# Altium footprint library AltiumilePcbCizimi_Library.PcbLib: 26 footprints (part 2 of 2)
Each footprint in its own frame and in the unit in brackets; x right, y up, seen from the top. Pads: shape width x height; smd on the part's side, far side on the other; paste and mask are expansions set on the pad; w line width, h text height; cw(c..) or ccw(c..) is an arc to the next point about the centre after c.
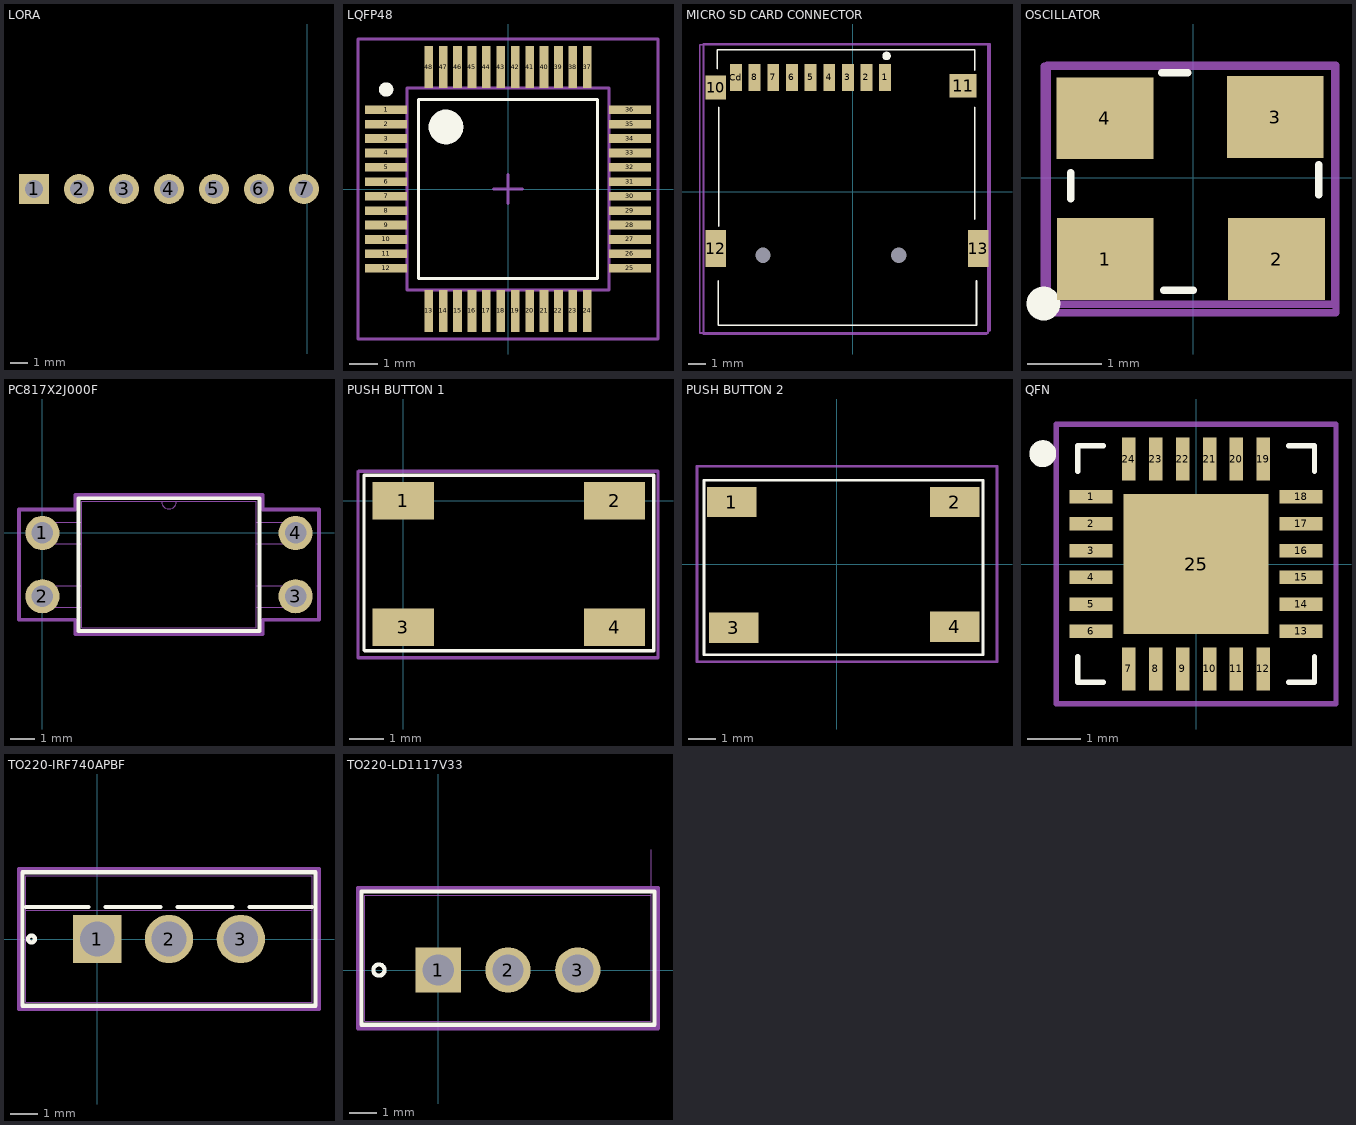
[diagram p1: the footprints below, top view; thin cyan lines are the x and y axes]

## LORA [mm] "E32-TTL-100 SX1278 433 MHz"
pads (7):
  rect 1.7x1.7 hole 1: 1(-15.436,55.692)
  round 1.7 hole 1: 2(-12.896,55.692) 3(-10.356,55.692) 4(-7.816,55.692) 5(-5.276,55.692) 6(-2.736,55.692) 7(-0.196,55.692)
3D body: height 26.07, standoff 16.07, extent 18.4,-0.2 18.4,-0.2
3D body "E32-TTL-100 module.STEP": height 68.25, standoff -6.03, extent -19.236,-19.83 120.721,57.192

## LQFP48 [mm] "TSQFP, 48-Leads, Body 7,00x7,00mm, Pitch 0,50mm, IPC Medium Density"
height 1.6
pads (48):
  rect 1.45x0.3 smd mask+0.05: 1(-4.225,2.75) 2(-4.225,2.25) 3(-4.225,1.75) 4(-4.225,1.25) 5(-4.225,0.75) 6(-4.225,0.25) 7(-4.225,-0.25) 8(-4.225,-0.75) 9(-4.225,-1.25) 10(-4.225,-1.75) 11(-4.225,-2.25) 12(-4.225,-2.75) 25(4.225,-2.75) 26(4.225,-2.25) 27(4.225,-1.75) 28(4.225,-1.25) 29(4.225,-0.75) 30(4.225,-0.25) 31(4.225,0.25) 32(4.225,0.75) 33(4.225,1.25) 34(4.225,1.75) 35(4.225,2.25) 36(4.225,2.75)
  rect 0.3x1.45 smd mask+0.05: 13(-2.75,-4.225) 14(-2.25,-4.225) 15(-1.75,-4.225) 16(-1.25,-4.225) 17(-0.75,-4.225) 18(-0.25,-4.225) 19(0.25,-4.225) 20(0.75,-4.225) 21(1.25,-4.225) 22(1.75,-4.225) 23(2.25,-4.225) 24(2.75,-4.225) 37(2.75,4.225) 38(2.25,4.225) 39(1.75,4.225) 40(1.25,4.225) 41(0.75,4.225) 42(0.25,4.225) 43(-0.25,4.225) 44(-0.75,4.225) 45(-1.25,4.225) 46(-1.75,4.225) 47(-2.25,4.225) 48(-2.75,4.225)
Top Overlay:
  circle w0.25: c-4.225,3.45 r0.125
  circle w0.6: c-2.15,2.15 r0.3
  lines w0.1: -3.1,-3.1 -3.1,3.1 3.1,3.1 3.1,-3.1 -3.1,-3.1
Mechanical 13:
  circle w0.1: c-2.127,2.172 r0.5
  lines w0.1: -3.5,-3.5 -3.5,3.5 3.5,3.5 3.5,-3.5 -3.5,-3.5
Mechanical 15:
  lines w0.1: -0.5,0 0.5,0 ; 0,-0.5 0,0.5 ; -5.2,-5.2 -5.2,5.2 5.2,5.2 5.2,-5.2 -5.2,-5.2
3D body "LQFP48.step": height 1.6, standoff 0, extent -4.5,-4.5 4.5,4.5

## MICRO SD CARD CONNECTOR [mm]
pads (15):
  rect 0.7x1.6 smd paste+0 mask+0: 1(1.918,6.735) 2(0.818,6.735) 3(-0.282,6.735) 4(-1.382,6.735) 5(-2.482,6.735) 6(-3.582,6.735) 7(-4.682,6.735) 8(-5.782,6.735) Cd(-6.882,6.735)
  rect 1.2x1.4 smd paste+0 mask+0: 10(-8.082,6.135)
  rect 1.6x1.4 smd paste+0 mask+0: 11(6.518,6.235)
  rect 1.2x2.2 smd paste+0 mask+0: 12(-8.082,-3.365) 13(7.418,-3.365)
  round 0 hole 0.9 unplated paste-1000 mask+0: ""(-5.282,-3.765) ""(2.718,-3.765)
Top Overlay:
  circle w0.25: c2,8 r0.125
  lines w0.1: -7.991,7.259 -7.991,8.359 7.209,8.359 7.209,7.159 ; -7.923,-5.265 -7.923,-7.888 7.309,-7.888 7.309,-5.265 ; -7.891,-2.041 -7.891,4.959 ; 7.209,-1.641 7.209,4.959
Mechanical 3:
  lines w0.1: -9.016,-8.341 -9.016,8.659 -8.516,8.659 7.734,8.659 7.984,8.659 7.984,-8.341 -9.016,-8.341
Mechanical 15:
  lines w0.1: -8.8,-8.4 -8.8,8.7 8.1,8.7 8.1,-8.2 7.9,-8.4 -8.8,-8.4
3D body "User Library-MEM2055-00-190-01-A_revG.step": height 1.85, standoff -0.6, extent -8.333,-7.76 7.667,7.49

## OSCILLATOR [mm] "8MHZ 12.5pF"
pads (4):
  rect 1.3x1.1 smd mask+0.05: 1(-1.181,-1.09) 2(1.119,-1.09) 3(1.103,0.817) 4(-1.186,0.801)
Top Overlay:
  circle w0.254: c-2.012,-1.689 r0.1
  lines w0.1: -1.645,-0.282 -1.645,0.072 ; -0.424,1.41 -0.07,1.41 ; -0.399,-1.511 0.001,-1.511 ; 1.684,-0.224 1.684,0.176
Mechanical 3:
  circle w0.254: c-1.416,-1.124 r0.1
  lines w0.1: -1.961,-1.811 -1.961,1.513 1.918,1.513 1.918,-1.811 -1.961,-1.811
Mechanical 15:
  lines w0.1: -2,-1.8 -1.9,-1.7 1.9,-1.7 1.9,1.5 -2,1.5 -2,-1.8
3D body "ASE3.STEP": height 1.22, standoff -0.03, extent -1.579,-1.241 1.621,1.259

## PC817X2J000F [mil]
pads (4):
  round 54 hole 34 mask+0: 1(0,0) 2(0,-100) 3(400,-100) 4(400,0)
Top Overlay:
  lines w6: 57,-155 57,55 343,55 343,-155 57,-155
Mechanical 13:
  lines w0: 188,50 ccw(c200,50) 212,50
  lines w1: -17,-117 62,-117 62,-83 -17,-83 -17,-117 ; -17,-17 62,-17 62,17 -17,17 -17,-17 ; 62,-150 62,50 338,50 338,-150 62,-150 ; 338,-117 417,-117 417,-83 338,-83 338,-117 ; 338,-17 417,-17 417,17 338,17 338,-17
Mechanical 15:
  lines w6: -37,-137 52,-137 52,-160 348,-160 348,-137 437,-137 437,37 348,37 348,60 52,60 52,37 -37,37 -37,-137
3D body: height 10, standoff 0, extent 0,0 10,10

## PUSH BUTTON 1 [mm]
pads (4):
  rect 1.8x1.1 smd mask+0.05: 1(0,0) 2(6.2,0) 3(0,-3.7) 4(6.2,-3.7)
Top Overlay:
  lines w0.1: -1.15,-4.375 -1.15,0.75 7.35,0.75 7.35,-4.4 -1.125,-4.4
Mechanical 3:
  lines w0.1: -1.325,-4.6 -1.325,0.85 -1.3,0.875 7.475,0.875 7.475,-4.6 -1.325,-4.6
3D body "User Library-4x4_SMD_Switch.step": height 1.5, standoff 0, extent -0.2,-4.5 6.2,0.7

## PUSH BUTTON 2 [mm]
pads (4):
  rect 1.8x1.1 smd mask+0.05: 1(-3.81,2.254) 2(4.3,2.254) 3(-3.748,-2.322) 4(4.3,-2.286)
Top Overlay:
  lines w0.1: -4.826,-3.302 -4.826,3.048 5.334,3.048 5.334,-3.302 -4.826,-3.302
Mechanical 15:
  lines w0.1: -5.08,-3.556 -5.08,3.302 -5.08,3.556 5.842,3.556 5.842,-3.556 -5.08,-3.556
3D body "User Library-KFC-A06-HA-4_3.STEP": height 4.3, standoff 0, extent -4.246,-3.048 4.754,2.952

## QFN [mm] "QFN, 24-Leads, Body 4,00x4,00mm, Pitch 0,50mm, Thermal Pad 2,70x2,60mm, IPC Medium Density"
height 0.95
pads (25):
  rect 0.8x0.25 smd mask+0.05: 1(-1.95,1.25) 2(-1.95,0.75) 3(-1.95,0.25) 4(-1.95,-0.25) 5(-1.95,-0.75) 6(-1.95,-1.25) 13(1.95,-1.25) 14(1.95,-0.75) 15(1.95,-0.25) 16(1.95,0.25) 17(1.95,0.75) 18(1.95,1.25)
  rect 0.25x0.8 smd mask+0.05: 7(-1.25,-1.95) 8(-0.75,-1.95) 9(-0.25,-1.95) 10(0.25,-1.95) 11(0.75,-1.95) 12(1.25,-1.95) 19(1.25,1.95) 20(0.75,1.95) 21(0.25,1.95) 22(-0.25,1.95) 23(-0.75,1.95) 24(-1.25,1.95)
  rect 2.7x2.6 smd mask+0.05: 25(0,0)
Top Overlay:
  circle w0.25: c-2.85,2.05 r0.125
  lines w0.1: -2.2,-1.725 -2.2,-2.2 -1.725,-2.2 ; -2.2,1.725 -2.2,2.2 -1.725,2.2 ; 1.725,-2.2 2.2,-2.2 2.2,-1.725 ; 1.725,2.2 2.2,2.2 2.2,1.725
Mechanical 15:
  lines w0.1: -0.5,0 0.5,0 ; 0,-0.5 0,0.5 ; -2.6,-2.6 -2.6,2.6 2.6,2.6 2.6,-2.6 -2.6,-2.6
3D body "QFN.step": height 0.95, standoff 0, extent -2.07,-2.07 2.07,2.07

## TO220-IRF740APBF [mil]
pads (3):
  rect 70x70 / inner round 70 / far side round 70 hole 50 mask+0: 1(0,0)
  round 70 hole 50 mask+0: 2(103.94,0) 3(207.87,0)
Top Overlay:
  circle w6: c-95,0 r5
  lines w6: -103.06,46.5 -12.3,46.5 ; 12.3,46.5 91.63,46.5 ; 116.24,46.5 195.57,46.5 ; 220.18,46.5 310.94,46.5 ; -108.06,-96.5 -108.06,96.5 315.94,96.5 315.94,-96.5 -108.06,-96.5
Mechanical 7:
Mechanical 13:
  circle w0: c-93.06,0 r5
  lines w1: -103.06,41.5 310.94,41.5 ; -103.06,-91.5 -103.06,91.5 310.94,91.5 310.94,-91.5 -103.06,-91.5
Mechanical 15:
  lines w6: -113.06,-101.5 320.94,-101.5 320.94,101.5 -113.06,101.5 -113.06,-101.5
3D body: height 10, standoff 0, extent 0,0 10,10

## TO220-LD1117V33 [mil]
pads (3):
  rect 65x65 hole 45: 1(0,0)
  round 65 hole 45: 2(100,0) 3(200,0)
Top Overlay:
  circle w6: c-85,0 r8
  lines w6: -110,-78.5 -110,112.5 310,112.5 310,-78.5 -110,-78.5
Mechanical 7:
  lines w1: 305,17 305,172.5
Mechanical 13:
  circle w0: c-85,0 r8
  lines w1: -105,-73.5 -105,107.5 305,107.5 305,-73.5 -105,-73.5
  lines w6: -10,0 10,0 ; 0,-10 0,10
Mechanical 15:
  lines w6: -115,-83.5 315,-83.5 315,117.5 -115,117.5 -115,-83.5
3D body: height 10, standoff 0, extent 0,0 10,10